# Altium footprint library Transformer_PQ.PcbLib: 8 footprints
Each footprint in its own frame and in the unit in brackets; x right, y up, seen from the top. Pads: shape width x height; smd on the part's side, far side on the other; paste and mask are expansions set on the pad; w line width, h text height; cw(c..) or ccw(c..) is an arc to the next point about the centre after c.
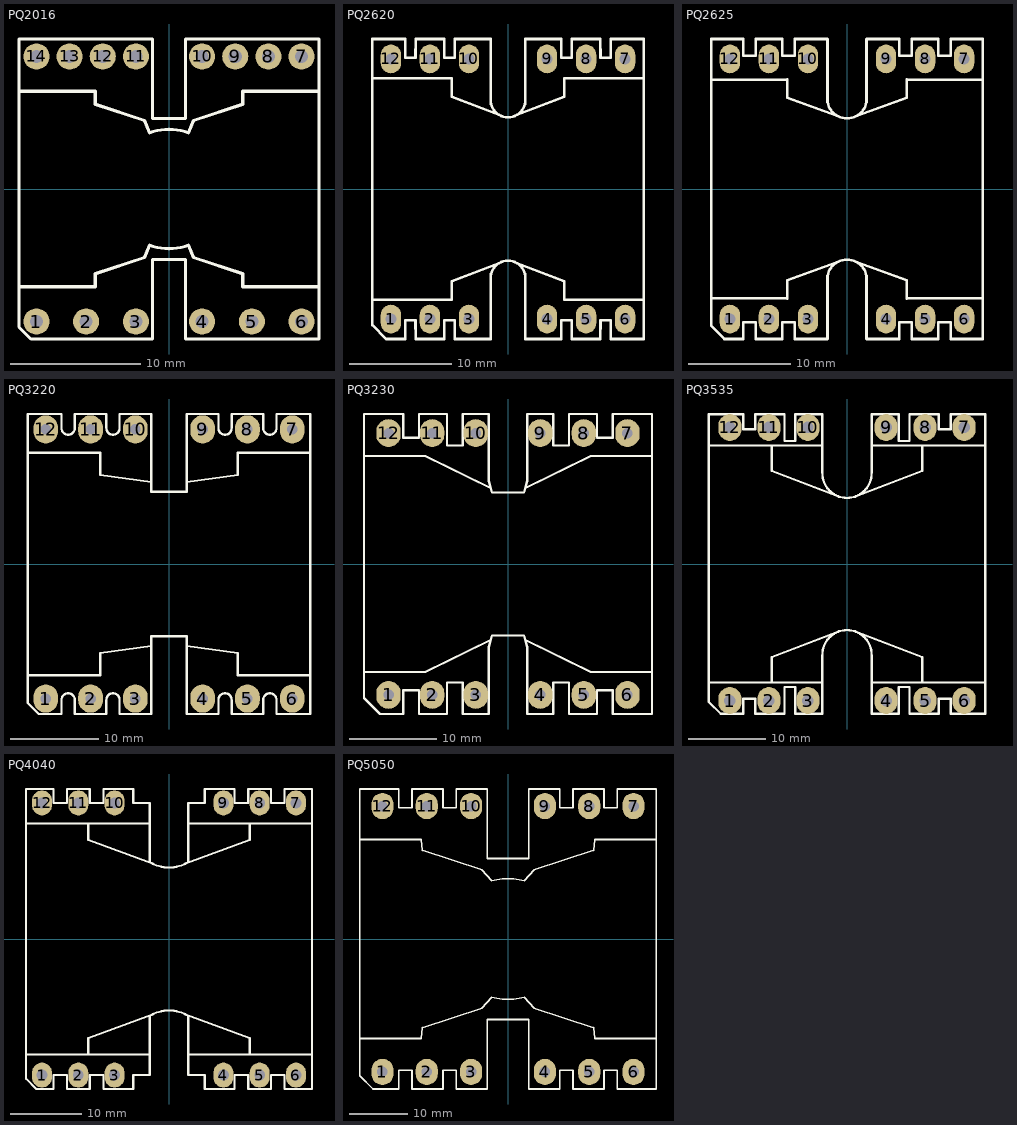
[diagram p0: the footprints below, top view; thin cyan lines are the x and y axes]

## PQ2016 [mm]
pads (14):
  round 2 hole 1: 1(-10.16,-10.16) 2(-6.35,-10.16) 3(-2.54,-10.16) 4(2.54,-10.16) 5(6.35,-10.16) 6(10.16,-10.16) 7(10.16,10.16) 8(7.62,10.16) 9(5.08,10.16) 10(2.54,10.16) 11(-2.54,10.16) 12(-5.08,10.16) 13(-7.62,10.16) 14(-10.16,10.16)
Top Overlay:
  lines w0.254: -11.5,-7.495 -5.65,-7.495 -5.65,-6.5 -1.875,-5.25 -1.5,-4.317 ccw(c0,0) 0,-4.57 ccw(c0,0) 1.5,-4.317 1.875,-5.25 5.65,-6.5 5.65,-7.495 11.5,-7.495 ; -11.5,7.495 -5.65,7.495 -5.65,6.5 -1.875,5.25 -1.5,4.317 cw(c0,0) 0,4.57 cw(c0,0) 1.5,4.317 1.875,5.25 5.65,6.5 5.65,7.495 11.5,7.495 ; -11.5,-10.583 -11.5,0 -11.5,11.5 -1.27,11.5 -1.27,5.4 0,5.4 1.27,5.4 1.27,11.5 11.5,11.5 11.5,0 11.5,-11.5 1.27,-11.5 1.27,-5.4 0,-5.4 -1.27,-5.4 -1.27,-11.5 -10.583,-11.5 -11.5,-10.583
3D body "PQ2620Transformer.STEP": height 18.09, standoff -3, extent -11.5,-11.5 11.5,11.5

## PQ2620 [mm]
pads (12):
  oval 2x2.8 hole 1.1: 1(-11.43,-12.7) 2(-7.62,-12.7) 3(-3.81,-12.7) 4(3.81,-12.7) 5(7.62,-12.7) 6(11.43,-12.7) 7(11.43,12.7) 8(7.62,12.7) 9(3.81,12.7) 10(-3.81,12.7) 11(-7.62,12.7) 12(-11.43,12.7)
Top Overlay:
  lines w0.254: -13.25,-10.8 -5.5,-10.8 -5.5,-9 -0.889,-7.239 ; -13.25,10.8 -5.5,10.8 -5.5,9 -0.889,7.239 ; -1.7,-8.504 -1.7,-14.65 -5.207,-14.65 -5.207,-12.827 -6.209,-12.827 -6.237,-14.65 -7.62,-14.65 -9.003,-14.65 -9.031,-12.827 -10.047,-12.827 -10.047,-14.65 -11.893,-14.65 -13.25,-13.293 -13.25,0 -13.25,14.65 -10.047,14.65 -10.047,12.827 -9.031,12.827 -9.003,14.65 -7.62,14.65 -6.237,14.65 -6.209,12.827 -5.207,12.827 -5.207,14.65 -1.7,14.65 -1.7,8.504 ; 0.889,-7.239 5.5,-9 5.5,-10.8 13.25,-10.8 ; 0.889,7.239 5.5,9 5.5,10.8 13.25,10.8 ; 1.7,-8.504 1.7,-14.65 5.207,-14.65 5.207,-12.827 6.209,-12.827 6.237,-14.65 7.62,-14.65 9.003,-14.65 9.031,-12.827 10.047,-12.827 10.047,-14.65 13.25,-14.65 13.25,0 13.25,14.65 10.047,14.65 10.047,12.827 9.031,12.827 9.003,14.65 7.62,14.65 6.237,14.65 6.209,12.827 5.207,12.827 5.207,14.65 1.7,14.65 1.7,8.504 ; -1.7,-8.514 cw(c0,-8.711) 1.7,-8.514 ccw(c0,-8.711) -1.7,-8.514 ; -1.7,8.514 ccw(c0,8.711) 1.7,8.514 cw(c0,8.711) -1.7,8.514
3D body "PQ26x20Transformer.STEP": height 24.9, standoff -3.8, extent -13.33,-14.65 13.33,14.65

## PQ2625 [mm]
pads (12):
  oval 2x2.8 hole 1.1: 1(-11.43,-12.7) 2(-7.62,-12.7) 3(-3.81,-12.7) 4(3.81,-12.7) 5(7.62,-12.7) 6(11.43,-12.7) 7(11.43,12.7) 8(7.62,12.7) 9(3.81,12.7) 10(-3.81,12.7) 11(-7.62,12.7) 12(-11.43,12.7)
Top Overlay:
  lines w0.254: -13.097,-10.687 -5.823,-10.697 -5.843,-8.91 -0.973,-7.15 ; -13.097,10.687 -5.823,10.697 -5.843,8.91 -0.973,7.15 ; -1.9,-8.5 -1.9,-14.65 -5.1,-14.65 -5.1,-13 -6.33,-13 -6.33,-14.65 -7.62,-14.65 -8.91,-14.65 -8.91,-13 -10.14,-13 -10.14,-14.65 -11.971,-14.65 -13.25,-13.371 -13.25,0 -13.25,14.65 -10.14,14.65 -10.14,13 -8.91,13 -8.91,14.65 -7.62,14.65 -6.33,14.65 -6.33,13 -5.1,13 -5.1,14.65 -1.9,14.65 -1.9,8.5 ; -1.9,-8.481 cw(c0,-8.831) 0,-6.899 cw(c0,-8.831) 1.9,-8.481 ; -1.9,8.481 ccw(c0,8.831) 0,6.899 ccw(c0,8.831) 1.9,8.481 ; 0.973,-7.15 5.843,-8.91 5.823,-10.697 13.097,-10.687 ; 0.973,7.15 5.843,8.91 5.823,10.697 13.097,10.687 ; 1.9,-8.5 1.9,-14.65 5.1,-14.65 5.1,-13 6.33,-13 6.33,-14.65 7.62,-14.65 8.91,-14.65 8.91,-13 10.14,-13 10.14,-14.65 13.25,-14.65 13.25,0 13.25,14.65 10.14,14.65 10.14,13 8.91,13 8.91,14.65 7.62,14.65 6.33,14.65 6.33,13 5.1,13 5.1,14.65 1.9,14.65 1.9,8.5
3D body "PQ26X25Transformer.STEP": height 29, standoff -3.8, extent -13.33,-14.777 13.33,14.523

## PQ3220 [mm]
pads (12):
  oval 2.8x3.2 hole 1.2: 1(-13.97,-15.25) 2(-8.89,-15.25) 3(-3.81,-15.25) 4(3.81,-15.25) 5(8.89,-15.25) 6(13.97,-15.25) 7(13.97,15.25) 8(8.89,15.25) 9(3.81,15.25) 10(-3.81,15.25) 11(-8.89,15.25) 12(-13.97,15.25)
Top Overlay:
  lines w0.254: -16,-12.6 -7.8,-12.6 -7.8,-10.1 -2,-9.282 ; -16,12.6 -7.8,12.6 -7.8,10.1 -2,9.282 ; 2,-9.282 7.8,-10.1 7.8,-12.6 16,-12.6 ; 2,9.282 7.8,10.1 7.8,12.6 16,12.6 ; -16,-15.757 -14.757,-17 -12.18,-17 -12.18,-15.4 cw(c-11.43,-15.4) -10.68,-15.4 -10.68,-17 -7.1,-17 -7.1,-15.4 cw(c-6.35,-15.4) -5.6,-15.4 -5.6,-17 -2,-17 -2,-8.2 0,-8.2 2,-8.2 2,-17 5.6,-17 5.6,-15.4 cw(c6.35,-15.4) 7.1,-15.4 7.1,-17 10.68,-17 10.68,-15.4 cw(c11.43,-15.4) 12.18,-15.4 12.18,-17 16,-17 16,0 16,17 12.18,17 12.18,15.4 cw(c11.43,15.4) 10.68,15.4 10.68,17 7.1,17 7.1,15.4 cw(c6.35,15.4) 5.6,15.4 5.6,17 2,17 2,8.2 0,8.2 -2,8.2 -2,17 -5.6,17 -5.6,15.4 cw(c-6.35,15.4) -7.1,15.4 -7.1,17 -10.68,17 -10.68,15.4 cw(c-11.43,15.4) -12.18,15.4 -12.18,17 -16,17 -16,0 -16,-15.757
3D body "PQ32X20Transformer.STEP": height 20.28, standoff -5, extent -16.08,-17 16.08,17

## PQ3230 [mm]
pads (12):
  oval 2.8x3.2 hole 1.2: 1(-13.7,-15) 2(-8.7,-15) 3(-3.7,-15) 4(3.7,-15) 5(8.7,-15) 6(13.7,-15) 7(13.7,15) 8(8.7,15) 9(3.7,15) 10(-3.7,15) 11(-8.7,15) 12(-13.7,15)
Top Overlay:
  lines w0.254: -7,-13.589 -7,-17.2 -10.2,-17.2 -10.2,-14.478 -12,-14.481 -12,-17.2 -14.677,-17.2 -16.5,-15.377 -16.5,-12.4 ; -7,13.589 -7,17.2 -10.2,17.2 -10.2,14.478 -12,14.481 -12,17.2 -16.5,17.2 -16.5,12.4 ; -6.985,-13.589 -5.2,-13.589 -5.2,-17.2 -2.2,-17.2 -2.2,-9.5 -1.844,-8.2 0,-8.2 1.844,-8.2 2.2,-9.5 2.2,-17.2 5.2,-17.2 5.2,-13.589 6.985,-13.589 ; -6.985,13.589 -5.2,13.589 -5.2,17.2 -2.2,17.2 -2.2,9.5 -1.844,8.2 0,8.2 1.844,8.2 2.2,9.5 2.2,17.2 5.2,17.2 5.2,13.589 6.985,13.589 ; -1.994,-8.717 -9.5,-12.4 -16.5,-12.4 ; -1.994,8.717 -9.5,12.4 -16.5,12.4 ; 1.994,-8.717 9.5,-12.4 16.5,-12.4 ; 1.994,8.717 9.5,12.4 16.5,12.4 ; 7,-13.589 7,-17.2 10.2,-17.2 10.2,-14.478 12,-14.481 12,-17.2 16.5,-17.2 16.5,-12.4 ; 7,13.589 7,17.2 10.2,17.2 10.2,14.478 12,14.481 12,17.2 16.5,17.2 16.5,12.4 ; -16.5,-12.4 -16.5,12.4 ; 16.5,-12.4 16.5,12.4
3D body "PQ3230Transformer.STEP": height 32.91, standoff -5, extent -16.5,-17.2 16.5,17.2

## PQ3535 [mm]
pads (12):
  oval 3x3.5 hole 1.5: 1(-15.24,-17.77) 2(-10.16,-17.77) 3(-5.08,-17.77) 4(5.08,-17.77) 5(10.16,-17.77) 6(15.24,-17.77) 7(15.24,17.77) 8(10.16,17.77) 9(5.08,17.77) 10(-5.08,17.77) 11(-10.16,17.77) 12(-15.24,17.77)
Top Overlay:
  lines w0.3: -18,-15.42 -3.204,-15.42 ; -18,15.42 -3.204,15.42 ; -9.779,-15.367 -9.779,-12.092 ; -9.779,12.092 -9.779,15.367 ; -9.776,-12.092 -1.064,-8.768 ; -9.776,12.092 -1.064,8.768 ; -3.204,-19.5 -6.731,-19.5 -6.731,-16.002 -8.128,-16.002 -8.128,-19.5 -11.938,-19.5 -11.938,-17.526 -13.499,-17.526 -13.499,-19.5 -16.441,-19.5 -18,-17.941 -18,0 -18,19.5 -13.499,19.5 -13.499,17.526 -11.938,17.526 -11.938,19.5 -8.128,19.5 -8.128,16.002 -6.731,16.002 -6.731,19.5 -3.204,19.5 ; -3.204,-19.431 -3.204,-11.84 ; -3.204,11.84 -3.204,19.431 ; -3.2,-11.8 cw(c0,-11.8) 0,-8.6 cw(c0,-11.8) 3.2,-11.8 ; -3.2,11.8 ccw(c0,11.8) 0,8.6 ccw(c0,11.8) 3.2,11.8 ; 1.064,-8.768 9.776,-12.092 ; 1.064,8.768 9.776,12.092 ; 3.204,-19.5 6.731,-19.5 6.731,-16.002 8.128,-16.002 8.128,-19.5 11.938,-19.5 11.938,-17.526 13.499,-17.526 13.499,-19.5 18,-19.5 18,0 18,19.5 13.499,19.5 13.499,17.526 11.938,17.526 11.938,19.5 8.128,19.5 8.128,16.002 6.731,16.002 6.731,19.5 3.204,19.5 ; 3.204,-19.431 3.204,-11.84 ; 3.204,-15.42 18,-15.42 ; 3.204,11.84 3.204,19.431 ; 3.204,15.42 18,15.42 ; 9.779,-15.367 9.779,-12.092 ; 9.779,12.092 9.779,15.367
3D body "PQ35x35Transformer.STEP": height 38.18, standoff -4, extent -18.05,-19.5 18.05,19.5

## PQ4040 [mm]
pads (12):
  oval 2.8x3.5 hole 1.5: 1(-17.78,-19.05) 2(-12.7,-19.05) 3(-7.62,-19.05) 4(7.62,-19.05) 5(12.7,-19.05) 6(17.78,-19.05) 7(17.78,19.05) 8(12.7,19.05) 9(7.62,19.05) 10(-7.62,19.05) 11(-12.7,19.05) 12(-17.78,19.05)
Top Overlay:
  lines w0.3: -20,-16.15 -2.7,-16.15 ; -20,16.15 -2.7,16.15 ; -11.3,-16.15 -11.3,-13.88 ; -11.3,13.88 -11.3,16.15 ; -11.251,-13.865 -2.286,-10.542 ; -11.251,13.865 -2.286,10.542 ; -2.702,-10.793 cw(c0,-15) 0,-10 cw(c0,-15) 2.702,-10.793 ; -2.702,10.793 ccw(c0,15) 0,10 ccw(c0,15) 2.702,10.793 ; -2.7,-10.795 -2.7,-19.05 -5,-19.05 -5,-21 -9.15,-21 -9.15,-19.05 -11.1,-19.05 -11.1,-21 -14.3,-21 -14.3,-19.05 -16.18,-19.05 -16.18,-21 -18.582,-21 -20,-19.582 -20,0 -20,21 -16.18,21 -16.18,19.05 -14.3,19.05 -14.3,21 -11.1,21 -11.1,19.05 -9.15,19.05 -9.15,21 -5,21 -5,19.05 -2.7,19.05 -2.7,10.795 ; 2.286,-10.542 11.251,-13.865 ; 2.286,10.542 11.251,13.865 ; 2.7,-16.15 20,-16.15 ; 2.7,-10.795 2.7,-19.05 5,-19.05 5,-21 9.15,-21 9.15,-19.05 11.1,-19.05 11.1,-21 14.3,-21 14.3,-19.05 16.18,-19.05 16.18,-21 20,-21 20,0 20,21 16.18,21 16.18,19.05 14.3,19.05 14.3,21 11.1,21 11.1,19.05 9.15,19.05 9.15,21 5,21 5,19.05 2.7,19.05 2.7,10.795 ; 2.7,16.15 20,16.15 ; 11.3,-16.15 11.3,-13.88 ; 11.3,13.88 11.3,16.15
3D body "PQ40x40Transformer.STEP": height 45, standoff -3.6, extent -20.33,-21 20.33,21

## PQ5050 [mm]
pads (12):
  oval 3.8x4.5 hole 1.8: 1(-21.59,-22.86) 2(-13.97,-22.86) 3(-6.35,-22.86) 4(6.35,-22.86) 5(13.97,-22.86) 6(21.59,-22.86) 7(21.59,22.86) 8(13.97,22.86) 9(6.35,22.86) 10(-6.35,22.86) 11(-13.97,22.86) 12(-21.59,22.86)
Top Overlay:
  lines w0.254: -2.819,-10.011 ccw(c0,0) 0,-10.4 ccw(c0,0) 2.819,-10.011 ; -2.819,10.011 cw(c0,0) 0,10.4 cw(c0,0) 2.819,10.011
  lines w0.3: -25.5,-17.1 -14.9,-17.1 -14.732,-15.24 -4.493,-11.927 -2.829,-10.045 ; -25.5,17.1 -14.9,17.1 -14.732,15.24 -4.493,11.927 -2.829,10.045 ; 2.829,-10.045 4.493,-11.927 14.732,-15.24 14.9,-17.1 25.5,-17.1 ; 2.829,10.045 4.493,11.927 14.732,15.24 14.9,17.1 25.5,17.1 ; -25.5,-23.522 -25.5,0 -25.5,25.8 -21.59,25.8 -18.796,25.8 -18.796,22.583 -17.78,22.583 -16.51,22.583 -16.51,25.8 -13.97,25.8 -11.176,25.8 -11.176,22.583 -10.16,22.583 -8.89,22.583 -8.89,25.8 -6.35,25.8 -3.556,25.8 -3.556,13.843 0,13.843 3.556,13.843 3.556,25.8 6.35,25.8 8.89,25.8 8.89,22.583 10.16,22.583 11.176,22.583 11.176,25.8 13.97,25.8 16.51,25.8 16.51,22.583 17.78,22.583 18.796,22.583 18.796,25.8 21.59,25.8 25.5,25.8 25.5,0 25.5,-25.8 21.59,-25.8 18.796,-25.8 18.796,-22.583 17.78,-22.583 16.51,-22.583 16.51,-25.8 13.97,-25.8 11.176,-25.8 11.176,-22.583 10.16,-22.583 8.89,-22.583 8.89,-25.8 6.35,-25.8 3.556,-25.8 3.556,-13.843 0,-13.843 -3.556,-13.843 -3.556,-25.8 -6.35,-25.8 -8.89,-25.8 -8.89,-22.583 -10.16,-22.583 -11.176,-22.583 -11.176,-25.8 -13.97,-25.8 -16.51,-25.8 -16.51,-22.583 -17.78,-22.583 -18.796,-22.583 -18.796,-25.8 -21.59,-25.8 -23.222,-25.8 -25.5,-23.522
3D body "PQ5050Transformer.STEP": height 51.9, standoff -7.7, extent -25.5,-25.8 25.5,25.8